# Altium footprint library pinghengche.PcbLib: 128 footprints (part 6 of 8)
Each footprint in its own frame and in the unit in brackets; x right, y up, seen from the top. Pads: shape width x height; smd on the part's side, far side on the other; paste and mask are expansions set on the pad; w line width, h text height; cw(c..) or ccw(c..) is an arc to the next point about the centre after c.
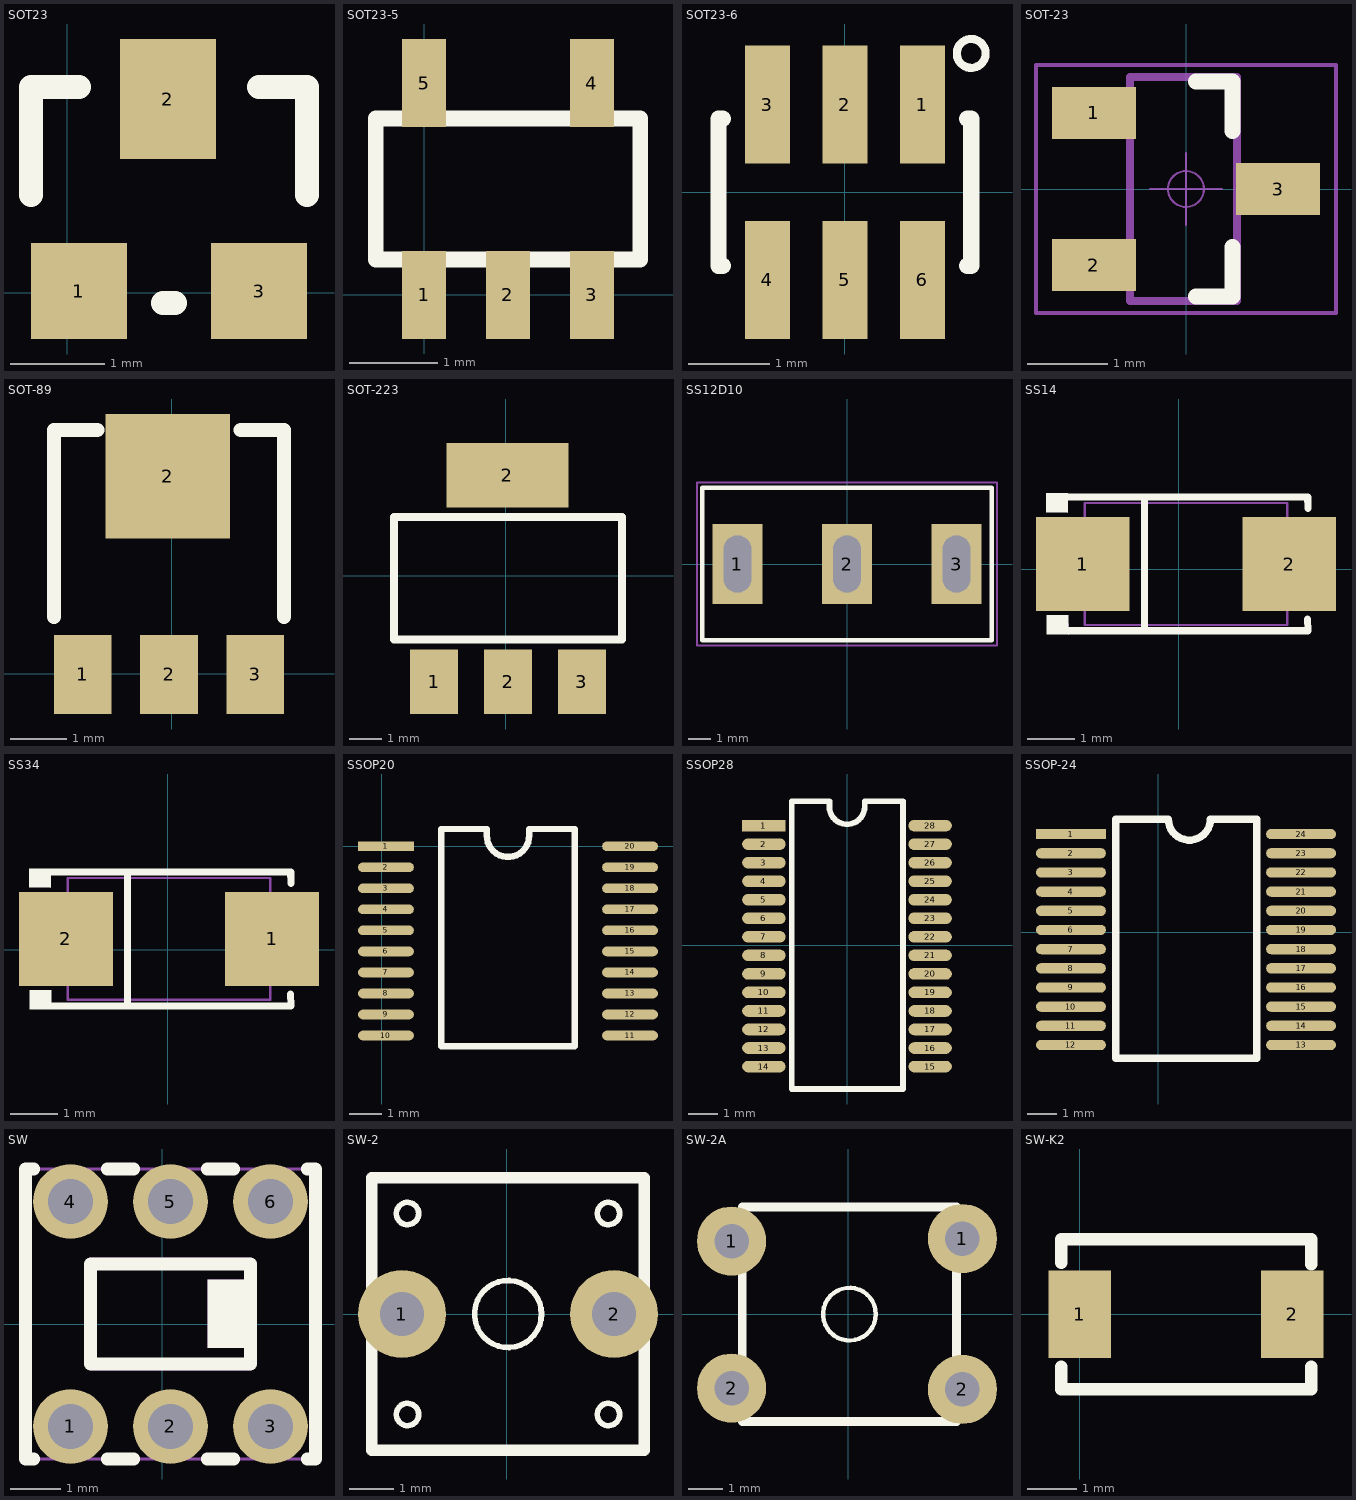
[diagram p5: the footprints below, top view; thin cyan lines are the x and y axes]

## SOT23 [mil]
pads (3):
  rect 40x40 smd: 1(4.88,0.63) 3(79.88,0.63)
  rect 40x50 smd: 2(41.88,80.63)
Top Overlay:
  lines w10: -15.12,40.63 -15.12,85.63 4.88,85.63 ; 39.88,-4.37 44.88,-4.37 ; 79.88,85.63 99.88,85.63 99.88,40.63
3D body "SOT-23-3.STEP": height 47.24, standoff 0, extent -14.87,-11.02 99.3,99.22

## SOT23-5 [mm]
pads (5):
  rect 0.5x1 smd: 1(0,0) 2(0.95,0) 3(1.9,0) 4(1.9,2.4) 5(0,2.4)
Top Overlay:
  lines w0.178: -0.55,0.4 2.45,0.4 2.45,2 -0.55,2 -0.55,0.4
3D body "User Library-SOT23-5.STEP": height 1.09, standoff -0.01, extent -0.5,-0.201 2.399,2.599

## SOT23-6 [mm] "SOT-23/SC-74A; 5 Leads; Body 3.1 x 3 mm, inc. leads (LxW max)"
height 1.45
pads (6):
  rect 0.55x1.45 smd: 1(0.95,1.075) 2(0,1.075) 3(-0.95,1.075) 4(-0.95,-1.075) 5(0,-1.075) 6(0.95,-1.075)
Top Overlay:
  circle w0.1: c1.549,1.702 r0.177
  lines w0.2: -1.5,-0.9 -1.55,-0.9 -1.55,0.9 -1.5,0.9 ; 1.5,-0.9 1.55,-0.9 1.55,0.9 1.5,0.9
3D body "User Library-SOT-23-6.STEP": height 1.08, standoff -0.01, extent -1.397,-1.194 1.397,1.232

## SOT-23 [mm]
height 2
pads (3):
  rect 1.05x0.65 smd: 1(-1.15,0.95) 2(-1.15,-0.95) 3(1.15,0)
Top Overlay:
  lines w0.2: 0.127,-1.346 0.584,-1.346 0.584,-0.725 ; 0.127,1.346 0.584,1.346 0.584,0.725
Top Component Center:
  circle w0.025: c0,0 r0.225
  lines w0.025: -0.45,0 0.45,0 ; 0,-0.45 0,0.45
Top Component Outline:
  lines w0.05: -1.875,-1.55 1.875,-1.55 1.875,1.55 -1.875,1.55 -1.875,-1.55
Top Designator:
  text ".Designator" at -2.252,-0.226 h1
Mechanical 13:
  lines w0.1: -0.7,-1.397 0.635,-1.397 0.635,1.397 -0.7,1.397 -0.7,-1.397
3D body "SOT-23-3P.STEP": height 1.2, standoff 0, extent -1.4,-1.45 1.4,1.45

## SOT-89 [mil]
pads (4):
  rect 40x55 smd: 1(-61.82,-0.57) 2(-1.82,-0.57) 3(58.18,-0.57)
  rect 86.61x86.61 smd: 2(-2.76,137.22)
Top Overlay:
  lines w10: -81.82,39.43 -81.82,169.43 -51.82,169.43 ; 48.18,169.43 78.18,169.43 78.18,39.43
3D body "SOT-89.STEP": height 59.45, standoff 0, extent -90.07,-6.45 87.1,162.85

## SOT-223 [mil]
pads (4):
  rect 59x79 smd: 1(-88,-130) 2(2.55,-130) 3(93.1,-130)
  rect 150x79 smd: 2(1.88,123.54)
Top Overlay:
  lines w10: -137.45,-78 -137.45,72 142.55,72 142.55,-78 -137.45,-78
3D body "SOT-223_MP04A.STEP": height 66.93, standoff 0, extent -126.41,-138.72 129.5,135.3

## SS12D10 [mm]
height 2
pads (3):
  rect 2.2x3.5 hole 2.5 slot 1.2 at 0 deg mask+0.07: 1(-4.8,0) 2(0,0) 3(4.8,0)
Top Overlay:
  lines w0.2: -6.35,-3.35 6.35,-3.35 6.35,3.35 -6.35,3.35 -6.35,-3.3
Top Component Center:
  circle w0.1: c0,0 r0.5
  lines w0.1: -1,0 1,0 ; 0,-1 0,1
Top Component Outline:
  lines w0.1: -6.575,-3.575 -6.575,3.575 6.575,3.575 6.575,-3.575 -6.575,-3.575
Top Designator:
  text ".Designator" at -2.252,-0.138 h1
3D body "ms-13aap1.stp": height 12.5, standoff -5.4, extent -6.4,-3.3 6.35,3.8

## SS14 [mm]
pads (2):
  rect 1.999x1.999 smd mask+0.051: 1(-2.049,0.107) 2(2.351,0.107)
Top Overlay:
  region: -2.361,-0.988 -2.361,-1.397 -2.821,-1.392 -2.818,-0.988
  region: -2.369,1.61 -2.371,1.201 -2.831,1.206 -2.826,1.61
  lines w0.152: -2.445,-1.318 2.747,-1.318 ; -2.445,1.534 2.747,1.534 2.755,1.293 ; -0.733,-1.318 -0.733,1.534 ; 2.744,-1.069 2.752,-1.308
Mechanical 6:
  region: 2.165,-0.569 2.165,0.782 1.962,0.782 1.962,-0.569
  region: 2.468,0.005 2.468,0.208 1.66,0.208 1.66,0.005
  region: -2.165,0.005 -2.165,0.208 -1.355,0.208 -1.355,0.005
Mechanical 15:
  region: -2.348,-1.194 -2.348,-1.169 -2.384,-1.133 -2.434,-1.133 -2.47,-1.169 -2.47,-1.194 -2.47,-1.219 -2.434,-1.255 -2.384,-1.255 -2.348,-1.219
  region: -1.284,0.831 -1.284,-0.617 -2.409,-0.617 -2.409,0.831
  region: 2.711,0.831 2.711,-0.617 1.586,-0.617 1.586,0.831
  lines w0.051: -2.008,-1.194 -2.008,1.407 2.31,1.407 2.31,-1.194 -2.008,-1.194

## SS34 [mm]
pads (2):
  rect 2x2 smd mask+0.051: 1(2.225,0.233) 2(-2.175,0.233)
Top Overlay:
  region: -2.487,-0.863 -2.488,-1.27 -2.948,-1.265 -2.944,-0.863
  region: -2.495,1.735 -2.496,1.328 -2.956,1.333 -2.952,1.735
  lines w0.152: -2.571,-1.194 2.621,-1.194 ; -2.571,1.659 2.621,1.659 2.628,1.42 ; -0.859,-1.194 -0.859,1.659 ; 2.618,-0.943 2.625,-1.182
Mechanical 6:
  region: 2.039,-0.442 2.039,0.908 1.836,0.908 1.836,-0.442
  region: 2.315,0.143 2.315,0.345 1.505,0.345 1.505,0.143
  region: -2.293,0.131 -2.293,0.334 -1.483,0.334 -1.483,0.131
Mechanical 15:
  region: -1.455,0.958 -1.455,-0.492 -2.58,-0.492 -2.58,0.958
  region: 2.63,0.957 2.63,-0.493 1.505,-0.493 1.505,0.957
  region: -2.52,-1.067 -2.52,-1.043 -2.555,-1.007 -2.605,-1.007 -2.64,-1.043 -2.64,-1.067 -2.64,-1.092 -2.605,-1.127 -2.555,-1.127 -2.52,-1.092
  lines w0.051: -2.135,-1.067 2.185,-1.067 2.185,1.533 -2.135,1.533 -2.135,-1.067

## SSOP20 [mm]
pads (20):
  rect 1.727x0.3 smd: 1(0.127,0)
  oval 1.727x0.3 smd: 2(0.127,-0.65) 3(0.127,-1.3) 4(0.127,-1.95) 5(0.127,-2.6) 6(0.127,-3.25) 7(0.127,-3.9) 8(0.127,-4.55) 9(0.127,-5.2) 10(0.127,-5.85) 11(7.673,-5.85) 12(7.673,-5.2) 13(7.673,-4.55) 14(7.673,-3.9) 15(7.673,-3.25) 16(7.673,-2.6) 17(7.673,-1.95) 18(7.673,-1.3) 19(7.673,-0.65) 20(7.673,0)
Top Overlay:
  lines w0.2: 1.835,-6.175 5.965,-6.175 5.965,0.533 4.555,0.533 4.555,0.325 cw(c3.9,0.325) 3.245,0.325 3.245,0.533 1.835,0.533 1.835,-6.175
3D body "SSOP-20.STEP": height 1.79, standoff -0.05, extent -0.013,-6.52 7.887,0.78

## SSOP28 [mm]
pads (28):
  rect 1.5x0.4 smd: 1(-2.869,4.127)
  oval 1.5x0.4 smd: 2(-2.869,3.488) 3(-2.869,2.848) 4(-2.869,2.208) 5(-2.869,1.568) 6(-2.869,0.928) 7(-2.869,0.288) 8(-2.869,-0.352) 9(-2.869,-0.992) 10(-2.869,-1.631) 11(-2.869,-2.271) 12(-2.869,-2.911) 13(-2.869,-3.551) 14(-2.87,-4.191) 15(2.869,-4.191) 16(2.869,-3.551) 17(2.869,-2.911) 18(2.869,-2.271) 19(2.869,-1.631) 20(2.869,-0.992) 21(2.869,-0.352) 22(2.869,0.288) 23(2.869,0.928) 24(2.869,1.568) 25(2.869,2.208) 26(2.869,2.848) 27(2.869,3.488) 28(2.869,4.127)
Top Overlay:
  lines w0.2: -1.905,-4.966 -1.905,4.966 -0.609,4.966 -0.609,4.783 ccw(c0,4.783) 0.609,4.783 0.609,4.966 1.93,4.966 1.93,-4.966 -1.905,-4.966
3D body "TSSOP28.STEP": height 1.05, standoff 0, extent -3.273,-4.889 3.327,4.91

## SSOP-24 [mm]
pads (24):
  rect 2.37x0.35 smd: 1(-2.959,3.33)
  oval 2.37x0.35 smd: 2(-2.959,2.68) 3(-2.959,2.03) 4(-2.959,1.38) 5(-2.959,0.73) 6(-2.959,0.08) 7(-2.959,-0.57) 8(-2.959,-1.22) 9(-2.959,-1.87) 10(-2.959,-2.52) 11(-2.959,-3.17) 12(-2.959,-3.82) 13(4.841,-3.82) 14(4.841,-3.17) 15(4.841,-2.52) 16(4.841,-1.87) 17(4.841,-1.22) 18(4.841,-0.57) 19(4.841,0.08) 20(4.841,0.73) 21(4.841,1.38) 22(4.841,2.03) 23(4.841,2.68) 24(4.841,3.33)
Top Overlay:
  lines w0.254: 3.289,-4.27 -1.435,-4.27 -1.435,3.83 0.335,3.83 0.343,3.838 ccw(c1.056,3.838) 1.769,3.838 3.332,3.838 3.34,3.83 3.34,-4.27
3D body "SSOP-24.step": height 1.97, standoff -0.02, extent -2.934,-4.544 4.966,4.086

## SW [mm]
pads (6):
  round 1.5 hole 0.9 mask+0.05: 1(-1.834,-2.044) 2(0.166,-2.044) 3(2.166,-2.044) 4(-1.834,2.456) 5(0.166,2.456) 6(2.166,2.456)
Top Overlay:
  region: 0.906,0.886 0.906,-0.454 0.906,-0.464 1.646,-0.464 1.646,0.886
  lines w0.254: -2.568,-2.694 -2.734,-2.694 -2.734,-1.543 -2.734,1.955 -2.734,3.106 -2.568,3.106 ; -1.1,-2.694 -0.568,-2.694 ; -1.1,3.106 -0.568,3.106 ; 0.9,-2.694 1.432,-2.694 ; 0.9,3.106 1.432,3.106 ; 2.9,-2.694 3.066,-2.694 3.066,-1.543 3.066,1.955 3.066,3.106 2.9,3.106 ; -1.434,-0.794 -1.434,1.206 1.766,1.206 1.766,-0.794 -1.434,-0.794
Mechanical 6:
  region: 0.906,0.886 0.906,-0.454 0.906,-0.464 1.646,-0.464 1.646,0.886
  region: 1.766,-0.674 1.886,-0.674 1.766,-0.914 -1.424,-0.914 -1.554,-0.784 -1.554,1.216 -1.444,1.326 1.766,1.326 1.876,1.256 1.876,-0.664 1.646,-0.664 1.646,1.086 -1.314,1.086 -1.314,-0.674 1.766,-0.674
Mechanical 15:
  region: -2.134,2.606 -1.534,2.606 -1.534,2.306 -2.134,2.306
  region: -0.134,2.606 0.466,2.606 0.466,2.306 -0.134,2.306
  region: 1.866,2.606 2.466,2.606 2.466,2.306 1.866,2.306
  region: 1.866,-1.894 2.466,-1.894 2.466,-2.194 1.866,-2.194
  region: -0.134,-1.894 0.466,-1.894 0.466,-2.194 -0.134,-2.194
  region: -2.134,-1.894 -1.534,-1.894 -1.534,-2.194 -2.134,-2.194
  region: -2.674,-2.694 -2.674,-2.669 -2.709,-2.634 -2.759,-2.634 -2.794,-2.669 -2.794,-2.694 -2.794,-2.719 -2.759,-2.754 -2.709,-2.754 -2.674,-2.719
  lines w0.051: -2.734,-2.694 3.066,-2.694 3.066,3.106 -2.734,3.106 -2.734,-2.694

## SW-2 [mm]
pads (2):
  round 2 hole 1: 1(-2.379,0.004) 2(2.447,0.004)
Top Overlay:
  circle w0.127: c0.034,0.004 r0.762
  circle w0.127: c-2.252,2.29 r0.254
  circle w0.127: c2.32,2.29 r0.254
  circle w0.127: c2.32,-2.282 r0.254
  circle w0.127: c-2.252,-2.282 r0.254
  lines w0.254: -3.065,-3.095 3.133,-3.095 3.133,3.103 -3.065,3.103 -3.065,-3.095
3D body "SW6X6.stp": height 4.3, standoff -14, extent -2.949,-3.097 3.051,3.103

## SW-2A [mm]
pads (4):
  round 2 hole 1: 1(-3.373,2.116) 1(3.299,2.189) 2(-3.373,-2.134) 2(3.299,-2.172)
Top Overlay:
  circle w0.127: c0.034,0.004 r0.762
  lines w0.254: -3.065,-3.095 -3.065,3.103 3.133,3.103 3.133,-3.095 -3.065,-3.095
3D body "4pin_TS-1143-WP.STEP": height 4.3, standoff -3.5, extent -4.125,-3.27 4.143,3.23

## SW-K2 [mil]
pads (2):
  rect 50x70 smd: 1(0,0) 2(170,0)
Top Overlay:
  lines w10: -15,-42 -15,-60 185,-60 185,-42 ; -15,41 -15,60 185,60 185,40
3D body "SW.STEP": height 78.74, standoff -3.94, extent -12.6,-58 182.6,60.11